# Altium footprint library LC-Standard-FootPrints-AD-V1.01.PcbLib: 555 footprints (part 14 of 35)
Each footprint in its own frame and in the unit in brackets; x right, y up, seen from the top. Pads: shape width x height; smd on the part's side, far side on the other; paste and mask are expansions set on the pad; w line width, h text height; cw(c..) or ccw(c..) is an arc to the next point about the centre after c.
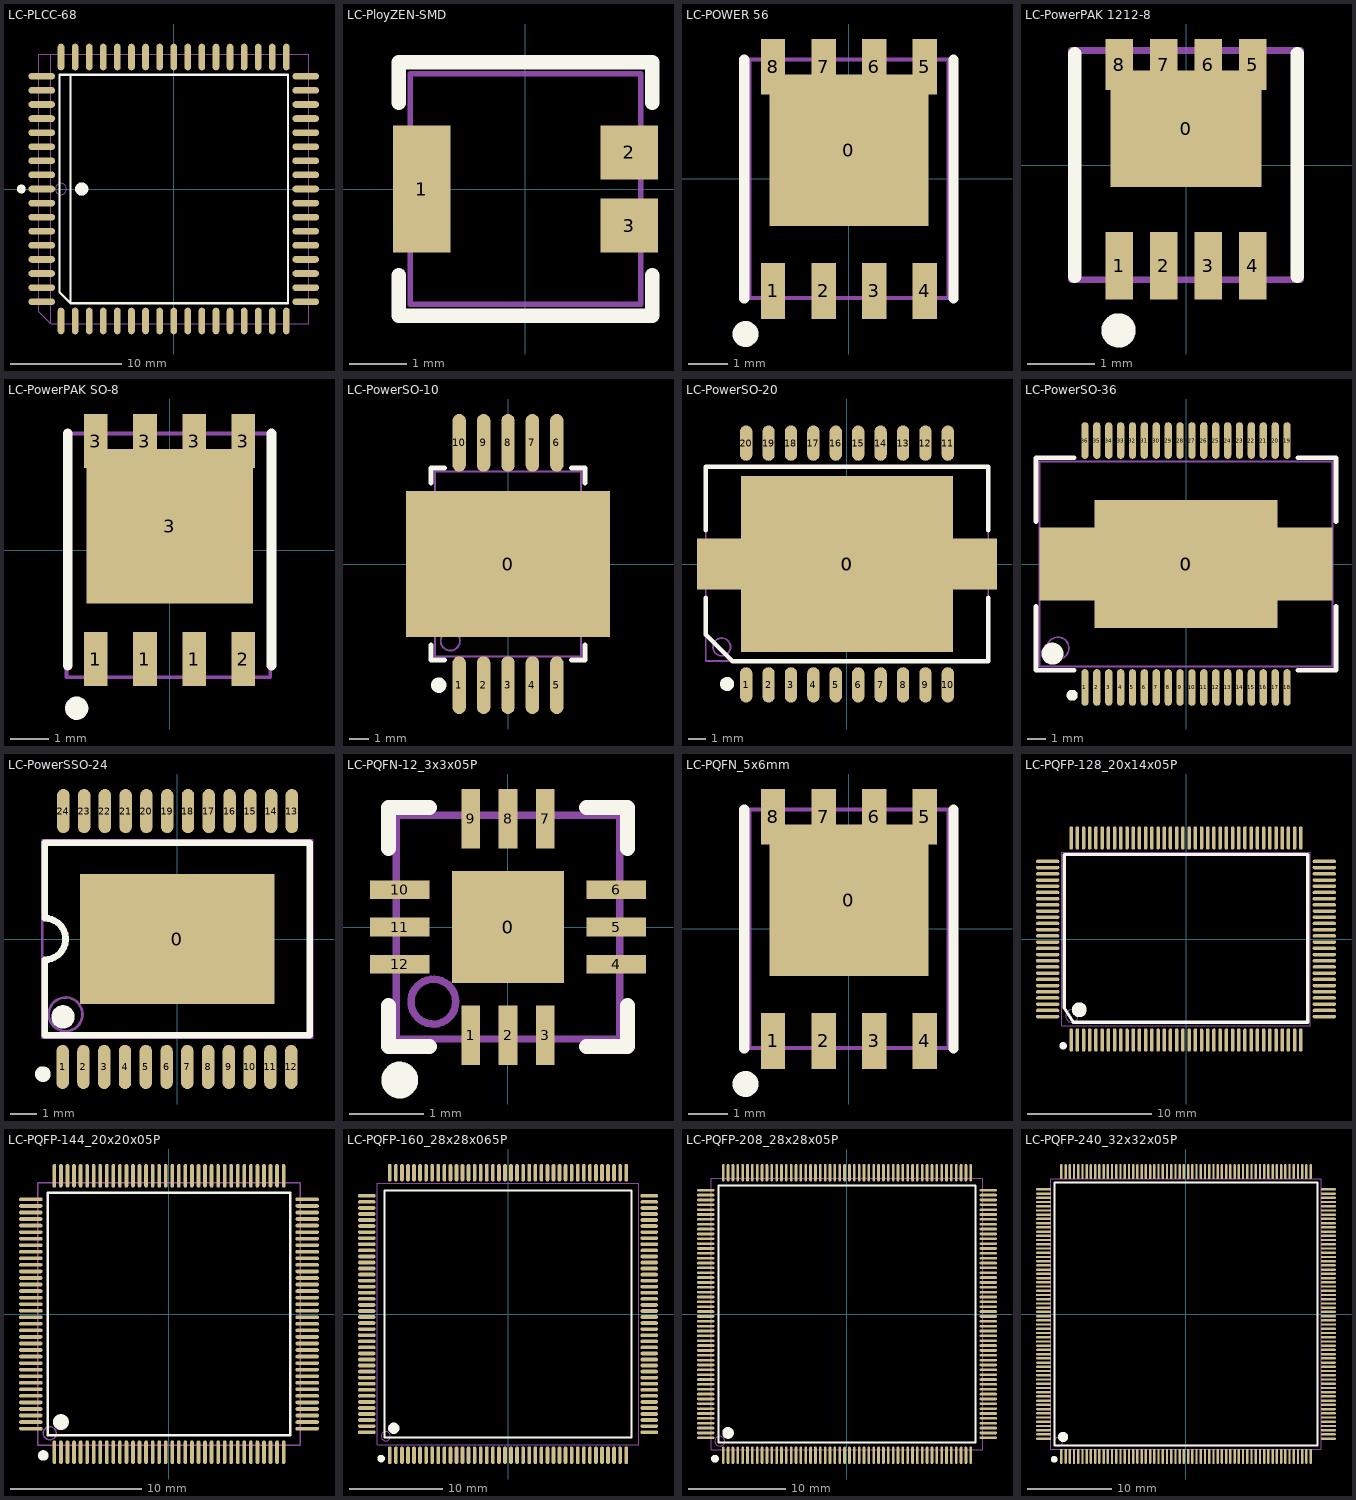
[diagram p13: the footprints below, top view; thin cyan lines are the x and y axes]

## LC-PLCC-68 [mm]
pads (68):
  oval 2.4x0.6 smd: 1(-11.9,0) 2(-11.9,-1.27) 3(-11.9,-2.54) 4(-11.9,-3.81) 5(-11.9,-5.08) 6(-11.9,-6.35) 7(-11.9,-7.62) 8(-11.9,-8.89) 9(-11.9,-10.16) 27(11.9,-10.16) 28(11.9,-8.89) 29(11.9,-7.62) 30(11.9,-6.35) 31(11.9,-5.08) 32(11.9,-3.81) 33(11.9,-2.54) 34(11.9,-1.27) 35(11.9,0) 36(11.9,1.27) 37(11.9,2.54) 38(11.9,3.81) 39(11.9,5.08) 40(11.9,6.35) 41(11.9,7.62) 42(11.9,8.89) 43(11.9,10.16) 61(-11.9,10.16) 62(-11.9,8.89) 63(-11.9,7.62) 64(-11.9,6.35) 65(-11.9,5.08) 66(-11.9,3.81) 67(-11.9,2.54) 68(-11.9,1.27)
  oval 0.6x2.4 smd: 10(-10.16,-11.9) 11(-8.89,-11.9) 12(-7.62,-11.9) 13(-6.35,-11.9) 14(-5.08,-11.9) 15(-3.81,-11.9) 16(-2.54,-11.9) 17(-1.27,-11.9) 18(0,-11.9) 19(1.27,-11.9) 20(2.54,-11.9) 21(3.81,-11.9) 22(5.08,-11.9) 23(6.35,-11.9) 24(7.62,-11.9) 25(8.89,-11.9) 26(10.16,-11.9) 44(10.16,11.9) 45(8.89,11.9) 46(7.62,11.9) 47(6.35,11.9) 48(5.08,11.9) 49(3.81,11.9) 50(2.54,11.9) 51(1.27,11.9) 52(0,11.9) 53(-1.27,11.9) 54(-2.54,11.9) 55(-3.81,11.9) 56(-5.08,11.9) 57(-6.35,11.9) 58(-7.62,11.9) 59(-8.89,11.9) 60(-10.16,11.9)
Top Overlay:
  circle w0.4: c-13.75,0 r0.2
  circle w0.6: c-8.3,0 r0.3
  lines w0.2: -9.3,10.3 -9.3,-10.3 ; -9.3,-10.3 10.3,-10.3 10.3,10.3 -10.3,10.3 -10.3,-9.3 -9.3,-10.3
Mechanical 13:
  circle w0.1: c-10.165,0 r0.5
  lines w0.1: -11.065,12.165 -11.065,-12.165 ; -11.065,-12.165 -12.165,-11.065 -12.165,12.165 12.165,12.165 12.165,-12.165 -11.065,-12.165

## LC-PloyZEN-SMD [mm] "Polymer Enhanced Zener Diode"
pads (3):
  rect 1x2.21 smd: 1(-1.8,0)
  rect 1x0.94 smd: 2(1.8,0.635) 3(1.8,-0.635)
Top Overlay:
  lines w0.254: -2.2,-1.5 -2.2,-2.2 2.2,-2.2 2.2,-1.5 ; -2.2,1.5 -2.2,2.2 2.2,2.2 2.2,1.5
Mechanical 13:
  lines w0.1: -2,-2 2,-2 2,2 -2,2 -2,-2

## LC-POWER 56 [mm]
pads (9):
  rect 4x3.81 smd: 0(0,0.716)
  rect 0.61x1.4 smd: 1(-1.905,-2.816) 2(-0.635,-2.816) 3(0.635,-2.816) 4(1.905,-2.816) 5(1.905,2.816) 6(0.635,2.816) 7(-0.635,2.816) 8(-1.905,2.816)
Top Overlay:
  circle w0.4: c-2.6,-3.9 r0.125
  lines w0.254: -2.63,-3 -2.63,3 ; 2.63,-3 2.63,3
Mechanical 13:
  lines w0.1: -2.5,-3 -2.5,3 2.5,3 2.5,-3 -2.5,-3

## LC-PowerPAK 1212-8 [mm]
pads (9):
  rect 2.235x1.725 smd mask+0.051: 0(0,0.54)
  rect 0.41x1 smd mask+0.051: 1(-0.99,-1.492) 2(-0.33,-1.492) 3(0.33,-1.492) 4(0.99,-1.492)
  rect 0.41x0.76 smd mask+0.051: 5(0.99,1.492) 6(0.33,1.492) 7(-0.33,1.492) 8(-0.99,1.492)
Top Overlay:
  circle w0.254: c-1,-2.45 r0.127
  lines w0.2: -1.65,-1.65 -1.65,1.65 ; 1.65,-1.65 1.65,1.65
Mechanical 13:
  lines w0.1: -1.7,-1.7 -1.7,1.7 1.7,1.7 1.7,-1.7 -1.7,-1.7

## LC-PowerPAK SO-8 [mm]
pads (9):
  rect 0.61x1.4 smd: 1(-1.905,-2.816) 1(-0.635,-2.816) 1(0.635,-2.816) 2(1.905,-2.816) 3(-1.905,2.816) 3(-0.635,2.816) 3(0.635,2.816) 3(1.905,2.816)
  rect 4.3x4 smd: 3(0,0.616)
Top Overlay:
  circle w0.3: c-2.4,-4.084 r0.15
  lines w0.254: -2.63,-2.984 -2.63,3.016 ; 2.63,-2.984 2.63,3.016
Mechanical 13:
  lines w0.1: -2.66,-3.284 -2.66,3.016 2.6,3.016 2.6,-3.284 -2.66,-3.284
3D body: height 1.04, standoff 0, extent -2.575,-3.184 2.575,2.966

## LC-PowerSO-10 [mm]
pads (11):
  rect 10.6x7.6 smd: 0(0,0)
  oval 0.7x3 smd: 1(-2.54,-6.3) 2(-1.27,-6.3) 3(0,-6.3) 4(1.27,-6.3) 5(2.54,-6.3) 6(2.54,6.3) 7(1.27,6.3) 8(0,6.3) 9(-1.27,6.3) 10(-2.54,6.3)
Top Overlay:
  circle w0.4: c-3.6,-6.3 r0.2
  lines w0.254: -4,-4.2 -4,-5 -3.3,-5 ; -4,4.2 -4,5 -3.3,5 ; 3.3,-5 4,-5 4,-4.2 ; 3.3,5 4,5 4,4.2
Mechanical 13:
  circle w0.1: c-3,-4 r0.5
  lines w0.1: -3.8,-4.8 3.8,-4.8 3.8,4.8 -3.8,4.8 -3.8,-4.8

## LC-PowerSO-20 [mm]
pads (22):
  rect 17x2.9 smd: 0(0,0)
  rect 12x10 smd: 0(0,0)
  oval 0.7x2 smd: 1(-5.715,-6.85) 2(-4.445,-6.85) 3(-3.175,-6.85) 4(-1.905,-6.85) 5(-0.635,-6.85) 6(0.635,-6.85) 7(1.905,-6.85) 8(3.175,-6.85) 9(4.445,-6.85) 10(5.715,-6.85) 11(5.715,6.85) 12(4.445,6.85) 13(3.175,6.85) 14(1.905,6.85) 15(0.635,6.85) 16(-0.635,6.85) 17(-1.905,6.85) 18(-3.175,6.85) 19(-4.445,6.85) 20(-5.715,6.85)
Top Overlay:
  circle w0.4: c-6.8,-6.8 r0.2
  lines w0.254: -8,-1.9 -8,-4 -6.5,-5.5 8,-5.5 8,-1.9 ; -8,1.9 -8,5.5 8,5.5 8,1.9
Mechanical 13:
  circle w0.1: c-7.1,-4.7 r0.5
  lines w0.1: -8,-5.5 8,-5.5 8,5.5 -8,5.5 -8,-5.5

## LC-PowerSO-36 [mm]
pads (38):
  rect 10x7 smd: 0(0,0)
  rect 16x4 smd: 0(0,0)
  oval 0.4x2 smd mask+0.051: 1(-5.525,-6.75) 2(-4.875,-6.75) 3(-4.225,-6.75) 4(-3.575,-6.75) 5(-2.925,-6.75) 6(-2.275,-6.75) 7(-1.625,-6.75) 8(-0.975,-6.75) 9(-0.325,-6.75) 10(0.325,-6.75) 11(0.975,-6.75) 12(1.625,-6.75) 13(2.275,-6.75) 14(2.925,-6.75) 15(3.575,-6.75) 16(4.225,-6.75) 17(4.875,-6.75) 18(5.525,-6.75) 19(5.525,6.75) 20(4.875,6.75) 21(4.225,6.75) 22(3.575,6.75) 23(2.925,6.75) 24(2.275,6.75) 25(1.625,6.75) 26(0.975,6.75) 27(0.325,6.75) 28(-0.325,6.75) 29(-0.975,6.75) 30(-1.625,6.75) 31(-2.275,6.75) 32(-2.925,6.75) 33(-3.575,6.75) 34(-4.225,6.75) 35(-4.875,6.75) 36(-5.525,6.75)
Top Overlay:
  circle w0.3: c-6.225,-7.175 r0.15
  circle w0.6: c-7.3,-4.9 r0.3
  lines w0.254: -8.2,-2.3 -8.2,-5.8 -6.1,-5.8 ; -8.2,2.3 -8.2,5.8 -6.1,5.8 ; 6.1,-5.8 8.2,-5.8 8.2,-2.3 ; 6.1,5.8 8.2,5.8 8.2,2.3
Mechanical 13:
  circle w0.1: c-7,-4.6 r0.6
  lines w0.1: -8,-5.6 -8,5.6 8,5.6 8,-5.6 -8,-5.6

## LC-PowerSSO-24 [mm]
pads (25):
  rect 7.5x5 smd: 0(0,0)
  oval 0.48x1.7 smd: 1(-4.412,-4.925) 2(-3.612,-4.925) 3(-2.812,-4.925) 4(-2.012,-4.925) 5(-1.212,-4.925) 6(-0.412,-4.925) 7(0.388,-4.925) 8(1.188,-4.925) 9(1.988,-4.925) 10(2.788,-4.925) 11(3.588,-4.925) 12(4.388,-4.925) 13(4.412,4.925) 14(3.612,4.925) 15(2.812,4.925) 16(2.012,4.925) 17(1.212,4.925) 18(0.412,4.925) 19(-0.388,4.925) 20(-1.188,4.925) 21(-1.988,4.925) 22(-2.788,4.925) 23(-3.588,4.925) 24(-4.388,4.925)
Top Overlay:
  circle w0.5: c-4.4,-3 r0.2
  circle w0.3: c-5.175,-5.2 r0.15
  lines w0.254: -5.1,-3.7 -5.1,-0.8 ccw(c-5.1,0) -5.1,0.8 -5.1,3.7 5.1,3.7 5.1,-3.7 -5.1,-3.7
Mechanical 13:
  circle w0.1: c-4.3,-2.9 r0.65
  lines w0.1: -5.2,-3.8 5.2,-3.8 5.2,3.8 -5.2,3.8 -5.2,-3.8

## LC-PQFN-12_3x3x05P [mm]
pads (13):
  rect 1.5x1.5 smd mask+0.051: 0(0,0)
  rect 0.25x0.8 smd mask+0.051: 1(-0.5,-1.45) 2(0,-1.45) 3(0.5,-1.45) 7(0.5,1.45) 8(0,1.45) 9(-0.5,1.45)
  rect 0.8x0.25 smd mask+0.051: 4(1.45,-0.5) 5(1.45,0) 6(1.45,0.5) 10(-1.45,0.5) 11(-1.45,0) 12(-1.45,-0.5)
Top Overlay:
  circle w0.254: c-1.45,-2.05 r0.12
  lines w0.2: -1.6,-1.05 -1.6,-1.6 -1.05,-1.6 ; -1.6,1.05 -1.6,1.6 -1.05,1.6 ; 1.05,-1.6 1.6,-1.6 1.6,-1.05 ; 1.05,1.6 1.6,1.6 1.6,1.05
Mechanical 13:
  circle w0.1: c-1,-1 r0.3
  lines w0.1: -1.5,-1.5 -1.5,1.5 1.5,1.5 1.5,-1.5 -1.5,-1.5

## LC-PQFN_5x6mm [mm]
pads (9):
  rect 4x3.81 smd: 0(0,0.716)
  rect 0.61x1.4 smd: 1(-1.905,-2.816) 2(-0.635,-2.816) 3(0.635,-2.816) 4(1.905,-2.816) 5(1.905,2.816) 6(0.635,2.816) 7(-0.635,2.816) 8(-1.905,2.816)
Top Overlay:
  circle w0.4: c-2.6,-3.9 r0.125
  lines w0.254: -2.63,-3 -2.63,3 ; 2.63,-3 2.63,3
Mechanical 13:
  lines w0.1: -2.5,-3 2.5,-3 2.5,3 -2.5,3 -2.5,-3

## LC-PQFP-128_20x14x05P [mm]
pads (128):
  oval 0.28x1.88 smd mask+0.051: 1(-9.25,-8.14) 2(-8.75,-8.14) 3(-8.25,-8.14) 4(-7.75,-8.14) 5(-7.25,-8.14) 6(-6.75,-8.14) 7(-6.25,-8.14) 8(-5.75,-8.14) 9(-5.25,-8.14) 10(-4.75,-8.14) 11(-4.25,-8.14) 12(-3.75,-8.14) 13(-3.25,-8.14) 14(-2.75,-8.14) 15(-2.25,-8.14) 16(-1.75,-8.14) 17(-1.25,-8.14) 18(-0.75,-8.14) 19(-0.25,-8.14) 20(0.25,-8.14) 21(0.75,-8.14) 22(1.25,-8.14) 23(1.75,-8.14) 24(2.25,-8.14) 25(2.75,-8.14) 26(3.25,-8.14) 27(3.75,-8.14) 28(4.25,-8.14) 29(4.75,-8.14) 30(5.25,-8.14) 31(5.75,-8.14) 32(6.25,-8.14) 33(6.75,-8.14) 34(7.25,-8.14) 35(7.75,-8.14) 36(8.25,-8.14) 37(8.75,-8.14) 38(9.25,-8.14) 65(9.25,8.14) 66(8.75,8.14) 67(8.25,8.14) 68(7.75,8.14) 69(7.25,8.14) 70(6.75,8.14) 71(6.25,8.14) 72(5.75,8.14) 73(5.25,8.14) 74(4.75,8.14) 75(4.25,8.14) 76(3.75,8.14) 77(3.25,8.14) 78(2.75,8.14) 79(2.25,8.14) 80(1.75,8.14) 81(1.25,8.14) 82(0.75,8.14) 83(0.25,8.14) 84(-0.25,8.14) 85(-0.75,8.14) 86(-1.25,8.14) 87(-1.75,8.14) 88(-2.25,8.14) 89(-2.75,8.14) 90(-3.25,8.14) 91(-3.75,8.14) 92(-4.25,8.14) 93(-4.75,8.14) 94(-5.25,8.14) 95(-5.75,8.14) 96(-6.25,8.14) 97(-6.75,8.14) 98(-7.25,8.14) 99(-7.75,8.14) 100(-8.25,8.14) 101(-8.75,8.14) 102(-9.25,8.14)
  oval 1.88x0.28 smd mask+0.051: 39(11.14,-6.25) 40(11.14,-5.75) 41(11.14,-5.25) 42(11.14,-4.75) 43(11.14,-4.25) 44(11.14,-3.75) 45(11.14,-3.25) 46(11.14,-2.75) 47(11.14,-2.25) 48(11.14,-1.75) 49(11.14,-1.25) 50(11.14,-0.75) 51(11.14,-0.25) 52(11.14,0.25) 53(11.14,0.75) 54(11.14,1.25) 55(11.14,1.75) 56(11.14,2.25) 57(11.14,2.75) 58(11.14,3.25) 59(11.14,3.75) 60(11.14,4.25) 61(11.14,4.75) 62(11.14,5.25) 63(11.14,5.75) 64(11.14,6.25) 103(-11.14,6.25) 104(-11.14,5.75) 105(-11.14,5.25) 106(-11.14,4.75) 107(-11.14,4.25) 108(-11.14,3.75) 109(-11.14,3.25) 110(-11.14,2.75) 111(-11.14,2.25) 112(-11.14,1.75) 113(-11.14,1.25) 114(-11.14,0.75) 115(-11.14,0.25) 116(-11.14,-0.25) 117(-11.14,-0.75) 118(-11.14,-1.25) 119(-11.14,-1.75) 120(-11.14,-2.25) 121(-11.14,-2.75) 122(-11.14,-3.25) 123(-11.14,-3.75) 124(-11.14,-4.25) 125(-11.14,-4.75) 126(-11.14,-5.25) 127(-11.14,-5.75) 128(-11.14,-6.25)
Top Overlay:
  circle w0.3: c-9.9,-8.6 r0.15
  circle w0.6: c-8.6,-5.7 r0.3
  lines w0.254: -9.8,-5.56 -9.8,6.8 9.8,6.8 9.8,-6.7 -9.087,-6.7 -9.8,-5.56
Mechanical 13:
  circle w0.1: c-9.2,-6.2 r0.5
  lines w0.1: -10,-7 -10,7 10,7 10,-7 -10,-7

## LC-PQFP-144_20x20x05P [mm]
pads (144):
  oval 0.28x1.8 smd mask+0.051: 1(-8.75,-10.55) 2(-8.25,-10.55) 3(-7.75,-10.55) 4(-7.25,-10.55) 5(-6.75,-10.55) 6(-6.25,-10.55) 7(-5.75,-10.55) 8(-5.25,-10.55) 9(-4.75,-10.55) 10(-4.25,-10.55) 11(-3.75,-10.55) 12(-3.25,-10.55) 13(-2.75,-10.55) 14(-2.25,-10.55) 15(-1.75,-10.55) 16(-1.25,-10.55) 17(-0.75,-10.55) 18(-0.25,-10.55) 19(0.25,-10.55) 20(0.75,-10.55) 21(1.25,-10.55) 22(1.75,-10.55) 23(2.25,-10.55) 24(2.75,-10.55) 25(3.25,-10.55) 26(3.75,-10.55) 27(4.25,-10.55) 28(4.75,-10.55) 29(5.25,-10.55) 30(5.75,-10.55) 31(6.25,-10.55) 32(6.75,-10.55) 33(7.25,-10.55) 34(7.75,-10.55) 35(8.25,-10.55) 36(8.75,-10.55) 73(8.75,10.55) 74(8.25,10.55) 75(7.75,10.55) 76(7.25,10.55) 77(6.75,10.55) 78(6.25,10.55) 79(5.75,10.55) 80(5.25,10.55) 81(4.75,10.55) 82(4.25,10.55) 83(3.75,10.55) 84(3.25,10.55) 85(2.75,10.55) 86(2.25,10.55) 87(1.75,10.55) 88(1.25,10.55) 89(0.75,10.55) 90(0.25,10.55) 91(-0.25,10.55) 92(-0.75,10.55) 93(-1.25,10.55) 94(-1.75,10.55) 95(-2.25,10.55) 96(-2.75,10.55) 97(-3.25,10.55) 98(-3.75,10.55) 99(-4.25,10.55) 100(-4.75,10.55) 101(-5.25,10.55) 102(-5.75,10.55) 103(-6.25,10.55) 104(-6.75,10.55) 105(-7.25,10.55) 106(-7.75,10.55) 107(-8.25,10.55) 108(-8.75,10.55)
  oval 1.8x0.28 smd mask+0.051: 37(10.55,-8.75) 38(10.55,-8.25) 39(10.55,-7.75) 40(10.55,-7.25) 41(10.55,-6.75) 42(10.55,-6.25) 43(10.55,-5.75) 44(10.55,-5.25) 45(10.55,-4.75) 46(10.55,-4.25) 47(10.55,-3.75) 48(10.55,-3.25) 49(10.55,-2.75) 50(10.55,-2.25) 51(10.55,-1.75) 52(10.55,-1.25) 53(10.55,-0.75) 54(10.55,-0.25) 55(10.55,0.25) 56(10.55,0.75) 57(10.55,1.25) 58(10.55,1.75) 59(10.55,2.25) 60(10.55,2.75) 61(10.55,3.25) 62(10.55,3.75) 63(10.55,4.25) 64(10.55,4.75) 65(10.55,5.25) 66(10.55,5.75) 67(10.55,6.25) 68(10.55,6.75) 69(10.55,7.25) 70(10.55,7.75) 71(10.55,8.25) 72(10.55,8.75) 109(-10.55,8.75) 110(-10.55,8.25) 111(-10.55,7.75) 112(-10.55,7.25) 113(-10.55,6.75) 114(-10.55,6.25) 115(-10.55,5.75) 116(-10.55,5.25) 117(-10.55,4.75) 118(-10.55,4.25) 119(-10.55,3.75) 120(-10.55,3.25) 121(-10.55,2.75) 122(-10.55,2.25) 123(-10.55,1.75) 124(-10.55,1.25) 125(-10.55,0.75) 126(-10.55,0.25) 127(-10.55,-0.25) 128(-10.55,-0.75) 129(-10.55,-1.25) 130(-10.55,-1.75) 131(-10.55,-2.25) 132(-10.55,-2.75) 133(-10.55,-3.25) 134(-10.55,-3.75) 135(-10.55,-4.25) 136(-10.55,-4.75) 137(-10.55,-5.25) 138(-10.55,-5.75) 139(-10.55,-6.25) 140(-10.55,-6.75) 141(-10.55,-7.25) 142(-10.55,-7.75) 143(-10.55,-8.25) 144(-10.55,-8.75)
Top Overlay:
  circle w0.4: c-9.6,-10.8 r0.2
  circle w0.6: c-8.25,-8.25 r0.3
  lines w0.2: -9.25,-9.25 9.25,-9.25 9.25,9.25 -9.25,9.25 -9.25,-9.25
Mechanical 13:
  circle w0.1: c-9.1,-9.1 r0.5
  lines w0.1: -10,-10 10,-10 10,10 -10,10 -10,-10

## LC-PQFP-160_28x28x065P [mm]
pads (160):
  oval 1.88x0.4 smd mask+0.051: 1(15.14,-12.675) 2(15.14,-12.025) 3(15.14,-11.375) 4(15.14,-10.725) 5(15.14,-10.075) 6(15.14,-9.425) 7(15.14,-8.775) 8(15.14,-8.125) 9(15.14,-7.475) 10(15.14,-6.825) 11(15.14,-6.175) 12(15.14,-5.525) 13(15.14,-4.875) 14(15.14,-4.225) 15(15.14,-3.575) 16(15.14,-2.925) 17(15.14,-2.275) 18(15.14,-1.625) 19(15.14,-0.975) 20(15.14,-0.325) 21(15.14,0.325) 22(15.14,0.975) 23(15.14,1.625) 24(15.14,2.275) 25(15.14,2.925) 26(15.14,3.575) 27(15.14,4.225) 28(15.14,4.875) 29(15.14,5.525) 30(15.14,6.175) 31(15.14,6.825) 32(15.14,7.475) 33(15.14,8.125) 34(15.14,8.775) 35(15.14,9.425) 36(15.14,10.075) 37(15.14,10.725) 38(15.14,11.375) 39(15.14,12.025) 40(15.14,12.675) 81(-15.14,12.675) 82(-15.14,12.025) 83(-15.14,11.375) 84(-15.14,10.725) 85(-15.14,10.075) 86(-15.14,9.425) 87(-15.14,8.775) 88(-15.14,8.125) 89(-15.14,7.475) 90(-15.14,6.825) 91(-15.14,6.175) 92(-15.14,5.525) 93(-15.14,4.875) 94(-15.14,4.225) 95(-15.14,3.575) 96(-15.14,2.925) 97(-15.14,2.275) 98(-15.14,1.625) 99(-15.14,0.975) 100(-15.14,0.325) 101(-15.14,-0.325) 102(-15.14,-0.975) 103(-15.14,-1.625) 104(-15.14,-2.275) 105(-15.14,-2.925) 106(-15.14,-3.575) 107(-15.14,-4.225) 108(-15.14,-4.875) 109(-15.14,-5.525) 110(-15.14,-6.175) 111(-15.14,-6.825) 112(-15.14,-7.475) 113(-15.14,-8.125) 114(-15.14,-8.775) 115(-15.14,-9.425) 116(-15.14,-10.075) 117(-15.14,-10.725) 118(-15.14,-11.375) 119(-15.14,-12.025) 120(-15.14,-12.675)
  oval 0.4x1.88 smd mask+0.051: 41(12.675,15.14) 42(12.025,15.14) 43(11.375,15.14) 44(10.725,15.14) 45(10.075,15.14) 46(9.425,15.14) 47(8.775,15.14) 48(8.125,15.14) 49(7.475,15.14) 50(6.825,15.14) 51(6.175,15.14) 52(5.525,15.14) 53(4.875,15.14) 54(4.225,15.14) 55(3.575,15.14) 56(2.925,15.14) 57(2.275,15.14) 58(1.625,15.14) 59(0.975,15.14) 60(0.325,15.14) 61(-0.325,15.14) 62(-0.975,15.14) 63(-1.625,15.14) 64(-2.275,15.14) 65(-2.925,15.14) 66(-3.575,15.14) 67(-4.225,15.14) 68(-4.875,15.14) 69(-5.525,15.14) 70(-6.175,15.14) 71(-6.825,15.14) 72(-7.475,15.14) 73(-8.125,15.14) 74(-8.775,15.14) 75(-9.425,15.14) 76(-10.075,15.14) 77(-10.725,15.14) 78(-11.375,15.14) 79(-12.025,15.14) 80(-12.675,15.14) 121(-12.675,-15.14) 122(-12.025,-15.14) 123(-11.375,-15.14) 124(-10.725,-15.14) 125(-10.075,-15.14) 126(-9.425,-15.14) 127(-8.775,-15.14) 128(-8.125,-15.14) 129(-7.475,-15.14) 130(-6.825,-15.14) 131(-6.175,-15.14) 132(-5.525,-15.14) 133(-4.875,-15.14) 134(-4.225,-15.14) 135(-3.575,-15.14) 136(-2.925,-15.14) 137(-2.275,-15.14) 138(-1.625,-15.14) 139(-0.975,-15.14) 140(-0.325,-15.14) 141(0.325,-15.14) 142(0.975,-15.14) 143(1.625,-15.14) 144(2.275,-15.14) 145(2.925,-15.14) 146(3.575,-15.14) 147(4.225,-15.14) 148(4.875,-15.14) 149(5.525,-15.14) 150(6.175,-15.14) 151(6.825,-15.14) 152(7.475,-15.14) 153(8.125,-15.14) 154(8.775,-15.14) 155(9.425,-15.14) 156(10.075,-15.14) 157(10.725,-15.14) 158(11.375,-15.14) 159(12.025,-15.14) 160(12.675,-15.14)
Top Overlay:
  circle w0.4: c-13.6,-15.5 r0.2
  circle w0.6: c-12.25,-12.25 r0.3
  lines w0.2: -13.25,-13.25 -13.25,13.25 13.25,13.25 13.25,-13.25 -13.25,-13.25
Mechanical 13:
  circle w0.1: c-13.1,-13.1 r0.5
  lines w0.1: -14,-14 -14,14 14,14 14,-14 -14,-14

## LC-PQFP-208_28x28x05P [mm]
pads (208):
  oval 0.28x1.8 smd mask+0.051: 1(-12.75,-14.55) 2(-12.25,-14.55) 3(-11.75,-14.55) 4(-11.25,-14.55) 5(-10.75,-14.55) 6(-10.25,-14.55) 7(-9.75,-14.55) 8(-9.25,-14.55) 9(-8.75,-14.55) 10(-8.25,-14.55) 11(-7.75,-14.55) 12(-7.25,-14.55) 13(-6.75,-14.55) 14(-6.25,-14.55) 15(-5.75,-14.55) 16(-5.25,-14.55) 17(-4.75,-14.55) 18(-4.25,-14.55) 19(-3.75,-14.55) 20(-3.25,-14.55) 21(-2.75,-14.55) 22(-2.25,-14.55) 23(-1.75,-14.55) 24(-1.25,-14.55) 25(-0.75,-14.55) 26(-0.25,-14.55) 27(0.25,-14.55) 28(0.75,-14.55) 29(1.25,-14.55) 30(1.75,-14.55) 31(2.25,-14.55) 32(2.75,-14.55) 33(3.25,-14.55) 34(3.75,-14.55) 35(4.25,-14.55) 36(4.75,-14.55) 37(5.25,-14.55) 38(5.75,-14.55) 39(6.25,-14.55) 40(6.75,-14.55) 41(7.25,-14.55) 42(7.75,-14.55) 43(8.25,-14.55) 44(8.75,-14.55) 45(9.25,-14.55) 46(9.75,-14.55) 47(10.25,-14.55) 48(10.75,-14.55) 49(11.25,-14.55) 50(11.75,-14.55) 51(12.25,-14.55) 52(12.75,-14.55) 105(12.75,14.55) 106(12.25,14.55) 107(11.75,14.55) 108(11.25,14.55) 109(10.75,14.55) 110(10.25,14.55) 111(9.75,14.55) 112(9.25,14.55) 113(8.75,14.55) 114(8.25,14.55) 115(7.75,14.55) 116(7.25,14.55) 117(6.75,14.55) 118(6.25,14.55) 119(5.75,14.55) 120(5.25,14.55) 121(4.75,14.55) 122(4.25,14.55) 123(3.75,14.55) 124(3.25,14.55) 125(2.75,14.55) 126(2.25,14.55) 127(1.75,14.55) 128(1.25,14.55) 129(0.75,14.55) 130(0.25,14.55) 131(-0.25,14.55) 132(-0.75,14.55) 133(-1.25,14.55) 134(-1.75,14.55) 135(-2.25,14.55) 136(-2.75,14.55) 137(-3.25,14.55) 138(-3.75,14.55) 139(-4.25,14.55) 140(-4.75,14.55) 141(-5.25,14.55) 142(-5.75,14.55) 143(-6.25,14.55) 144(-6.75,14.55) 145(-7.25,14.55) 146(-7.75,14.55) 147(-8.25,14.55) 148(-8.75,14.55) 149(-9.25,14.55) 150(-9.75,14.55) 151(-10.25,14.55) 152(-10.75,14.55) 153(-11.25,14.55) 154(-11.75,14.55) 155(-12.25,14.55) 156(-12.75,14.55)
  oval 1.8x0.28 smd mask+0.051: 53(14.55,-12.75) 54(14.55,-12.25) 55(14.55,-11.75) 56(14.55,-11.25) 57(14.55,-10.75) 58(14.55,-10.25) 59(14.55,-9.75) 60(14.55,-9.25) 61(14.55,-8.75) 62(14.55,-8.25) 63(14.55,-7.75) 64(14.55,-7.25) 65(14.55,-6.75) 66(14.55,-6.25) 67(14.55,-5.75) 68(14.55,-5.25) 69(14.55,-4.75) 70(14.55,-4.25) 71(14.55,-3.75) 72(14.55,-3.25) 73(14.55,-2.75) 74(14.55,-2.25) 75(14.55,-1.75) 76(14.55,-1.25) 77(14.55,-0.75) 78(14.55,-0.25) 79(14.55,0.25) 80(14.55,0.75) 81(14.55,1.25) 82(14.55,1.75) 83(14.55,2.25) 84(14.55,2.75) 85(14.55,3.25) 86(14.55,3.75) 87(14.55,4.25) 88(14.55,4.75) 89(14.55,5.25) 90(14.55,5.75) 91(14.55,6.25) 92(14.55,6.75) 93(14.55,7.25) 94(14.55,7.75) 95(14.55,8.25) 96(14.55,8.75) 97(14.55,9.25) 98(14.55,9.75) 99(14.55,10.25) 100(14.55,10.75) 101(14.55,11.25) 102(14.55,11.75) 103(14.55,12.25) 104(14.55,12.75) 157(-14.55,12.75) 158(-14.55,12.25) 159(-14.55,11.75) 160(-14.55,11.25) 161(-14.55,10.75) 162(-14.55,10.25) 163(-14.55,9.75) 164(-14.55,9.25) 165(-14.55,8.75) 166(-14.55,8.25) 167(-14.55,7.75) 168(-14.55,7.25) 169(-14.55,6.75) 170(-14.55,6.25) 171(-14.55,5.75) 172(-14.55,5.25) 173(-14.55,4.75) 174(-14.55,4.25) 175(-14.55,3.75) 176(-14.55,3.25) 177(-14.55,2.75) 178(-14.55,2.25) 179(-14.55,1.75) 180(-14.55,1.25) 181(-14.55,0.75) 182(-14.55,0.25) 183(-14.55,-0.25) 184(-14.55,-0.75) 185(-14.55,-1.25) 186(-14.55,-1.75) 187(-14.55,-2.25) 188(-14.55,-2.75) 189(-14.55,-3.25) 190(-14.55,-3.75) 191(-14.55,-4.25) 192(-14.55,-4.75) 193(-14.55,-5.25) 194(-14.55,-5.75) 195(-14.55,-6.25) 196(-14.55,-6.75) 197(-14.55,-7.25) 198(-14.55,-7.75) 199(-14.55,-8.25) 200(-14.55,-8.75) 201(-14.55,-9.25) 202(-14.55,-9.75) 203(-14.55,-10.25) 204(-14.55,-10.75) 205(-14.55,-11.25) 206(-14.55,-11.75) 207(-14.55,-12.25) 208(-14.55,-12.75)
Top Overlay:
  circle w0.6: c-12.25,-12.25 r0.3
  circle w0.4: c-13.6,-14.9 r0.2
  lines w0.2: -13.25,-13.25 13.25,-13.25 13.25,13.25 -13.25,13.25 -13.25,-13.25
Mechanical 13:
  circle w0.1: c-13.1,-13.1 r0.5
  lines w0.1: -14,-14 14,-14 14,14 -14,14 -14,-14

## LC-PQFP-240_32x32x05P [mm]
pads (240):
  oval 0.28x1.8 smd mask+0.051: 1(-14.75,-16.85) 2(-14.25,-16.85) 3(-13.75,-16.85) 4(-13.25,-16.85) 5(-12.75,-16.85) 6(-12.25,-16.85) 7(-11.75,-16.85) 8(-11.25,-16.85) 9(-10.75,-16.85) 10(-10.25,-16.85) 11(-9.75,-16.85) 12(-9.25,-16.85) 13(-8.75,-16.85) 14(-8.25,-16.85) 15(-7.75,-16.85) 16(-7.25,-16.85) 17(-6.75,-16.85) 18(-6.25,-16.85) 19(-5.75,-16.85) 20(-5.25,-16.85) 21(-4.75,-16.85) 22(-4.25,-16.85) 23(-3.75,-16.85) 24(-3.25,-16.85) 25(-2.75,-16.85) 26(-2.25,-16.85) 27(-1.75,-16.85) 28(-1.25,-16.85) 29(-0.75,-16.85) 30(-0.25,-16.85) 31(0.25,-16.85) 32(0.75,-16.85) 33(1.25,-16.85) 34(1.75,-16.85) 35(2.25,-16.85) 36(2.75,-16.85) 37(3.25,-16.85) 38(3.75,-16.85) 39(4.25,-16.85) 40(4.75,-16.85) 41(5.25,-16.85) 42(5.75,-16.85) 43(6.25,-16.85) 44(6.75,-16.85) 45(7.25,-16.85) 46(7.75,-16.85) 47(8.25,-16.85) 48(8.75,-16.85) 49(9.25,-16.85) 50(9.75,-16.85) 51(10.25,-16.85) 52(10.75,-16.85) 53(11.25,-16.85) 54(11.75,-16.85) 55(12.25,-16.85) 56(12.75,-16.85) 57(13.25,-16.85) 58(13.75,-16.85) 59(14.25,-16.85) 60(14.75,-16.85) 121(14.75,16.85) 122(14.25,16.85) 123(13.75,16.85) 124(13.25,16.85) 125(12.75,16.85) 126(12.25,16.85) 127(11.75,16.85) 128(11.25,16.85) 129(10.75,16.85) 130(10.25,16.85) 131(9.75,16.85) 132(9.25,16.85) 133(8.75,16.85) 134(8.25,16.85) 135(7.75,16.85) 136(7.25,16.85) 137(6.75,16.85) 138(6.25,16.85) 139(5.75,16.85) 140(5.25,16.85) 141(4.75,16.85) 142(4.25,16.85) 143(3.75,16.85) 144(3.25,16.85) 145(2.75,16.85) 146(2.25,16.85) 147(1.75,16.85) 148(1.25,16.85) 149(0.75,16.85) 150(0.25,16.85) 151(-0.25,16.85) 152(-0.75,16.85) 153(-1.25,16.85) 154(-1.75,16.85) 155(-2.25,16.85) 156(-2.75,16.85) 157(-3.25,16.85) 158(-3.75,16.85) 159(-4.25,16.85) 160(-4.75,16.85) 161(-5.25,16.85) 162(-5.75,16.85) 163(-6.25,16.85) 164(-6.75,16.85) 165(-7.25,16.85) 166(-7.75,16.85) 167(-8.25,16.85) 168(-8.75,16.85) 169(-9.25,16.85) 170(-9.75,16.85) 171(-10.25,16.85) 172(-10.75,16.85) 173(-11.25,16.85) 174(-11.75,16.85) 175(-12.25,16.85) 176(-12.75,16.85) 177(-13.25,16.85) 178(-13.75,16.85) 179(-14.25,16.85) 180(-14.75,16.85)
  oval 1.8x0.28 smd mask+0.051: 61(16.85,-14.75) 62(16.85,-14.25) 63(16.85,-13.75) 64(16.85,-13.25) 65(16.85,-12.75) 66(16.85,-12.25) 67(16.85,-11.75) 68(16.85,-11.25) 69(16.85,-10.75) 70(16.85,-10.25) 71(16.85,-9.75) 72(16.85,-9.25) 73(16.85,-8.75) 74(16.85,-8.25) 75(16.85,-7.75) 76(16.85,-7.25) 77(16.85,-6.75) 78(16.85,-6.25) 79(16.85,-5.75) 80(16.85,-5.25) 81(16.85,-4.75) 82(16.85,-4.25) 83(16.85,-3.75) 84(16.85,-3.25) 85(16.85,-2.75) 86(16.85,-2.25) 87(16.85,-1.75) 88(16.85,-1.25) 89(16.85,-0.75) 90(16.85,-0.25) 91(16.85,0.25) 92(16.85,0.75) 93(16.85,1.25) 94(16.85,1.75) 95(16.85,2.25) 96(16.85,2.75) 97(16.85,3.25) 98(16.85,3.75) 99(16.85,4.25) 100(16.85,4.75) 101(16.85,5.25) 102(16.85,5.75) 103(16.85,6.25) 104(16.85,6.75) 105(16.85,7.25) 106(16.85,7.75) 107(16.85,8.25) 108(16.85,8.75) 109(16.85,9.25) 110(16.85,9.75) 111(16.85,10.25) 112(16.85,10.75) 113(16.85,11.25) 114(16.85,11.75) 115(16.85,12.25) 116(16.85,12.75) 117(16.85,13.25) 118(16.85,13.75) 119(16.85,14.25) 120(16.85,14.75) 181(-16.85,14.75) 182(-16.85,14.25) 183(-16.85,13.75) 184(-16.85,13.25) 185(-16.85,12.75) 186(-16.85,12.25) 187(-16.85,11.75) 188(-16.85,11.25) 189(-16.85,10.75) 190(-16.85,10.25) 191(-16.85,9.75) 192(-16.85,9.25) 193(-16.85,8.75) 194(-16.85,8.25) 195(-16.85,7.75) 196(-16.85,7.25) 197(-16.85,6.75) 198(-16.85,6.25) 199(-16.85,5.75) 200(-16.85,5.25) 201(-16.85,4.75) 202(-16.85,4.25) 203(-16.85,3.75) 204(-16.85,3.25) 205(-16.85,2.75) 206(-16.85,2.25) 207(-16.85,1.75) 208(-16.85,1.25) 209(-16.85,0.75) 210(-16.85,0.25) 211(-16.85,-0.25) 212(-16.85,-0.75) 213(-16.85,-1.25) 214(-16.85,-1.75) 215(-16.85,-2.25) 216(-16.85,-2.75) 217(-16.85,-3.25) 218(-16.85,-3.75) 219(-16.85,-4.25) 220(-16.85,-4.75) 221(-16.85,-5.25) 222(-16.85,-5.75) 223(-16.85,-6.25) 224(-16.85,-6.75) 225(-16.85,-7.25) 226(-16.85,-7.75) 227(-16.85,-8.25) 228(-16.85,-8.75) 229(-16.85,-9.25) 230(-16.85,-9.75) 231(-16.85,-10.25) 232(-16.85,-10.75) 233(-16.85,-11.25) 234(-16.85,-11.75) 235(-16.85,-12.25) 236(-16.85,-12.75) 237(-16.85,-13.25) 238(-16.85,-13.75) 239(-16.85,-14.25) 240(-16.85,-14.75)
Top Overlay:
  circle w0.6: c-14.55,-14.55 r0.3
  circle w0.4: c-15.6,-17.2 r0.2
  lines w0.2: -15.55,-15.55 -15.55,15.55 15.55,15.55 15.55,-15.55 -15.55,-15.55
Mechanical 13:
  circle w0.1: c-15.1,-15.1 r0.5
  lines w0.1: -16,-16 -16,16 16,16 16,-16 -16,-16